# Altium footprint library 3M THD.PcbLib: 163 footprints (part 7 of 14)
Each footprint in its own frame and in the unit in brackets; x right, y up, seen from the top. Pads: shape width x height; smd on the part's side, far side on the other; paste and mask are expansions set on the pad; w line width, h text height; cw(c..) or ccw(c..) is an arc to the next point about the centre after c.
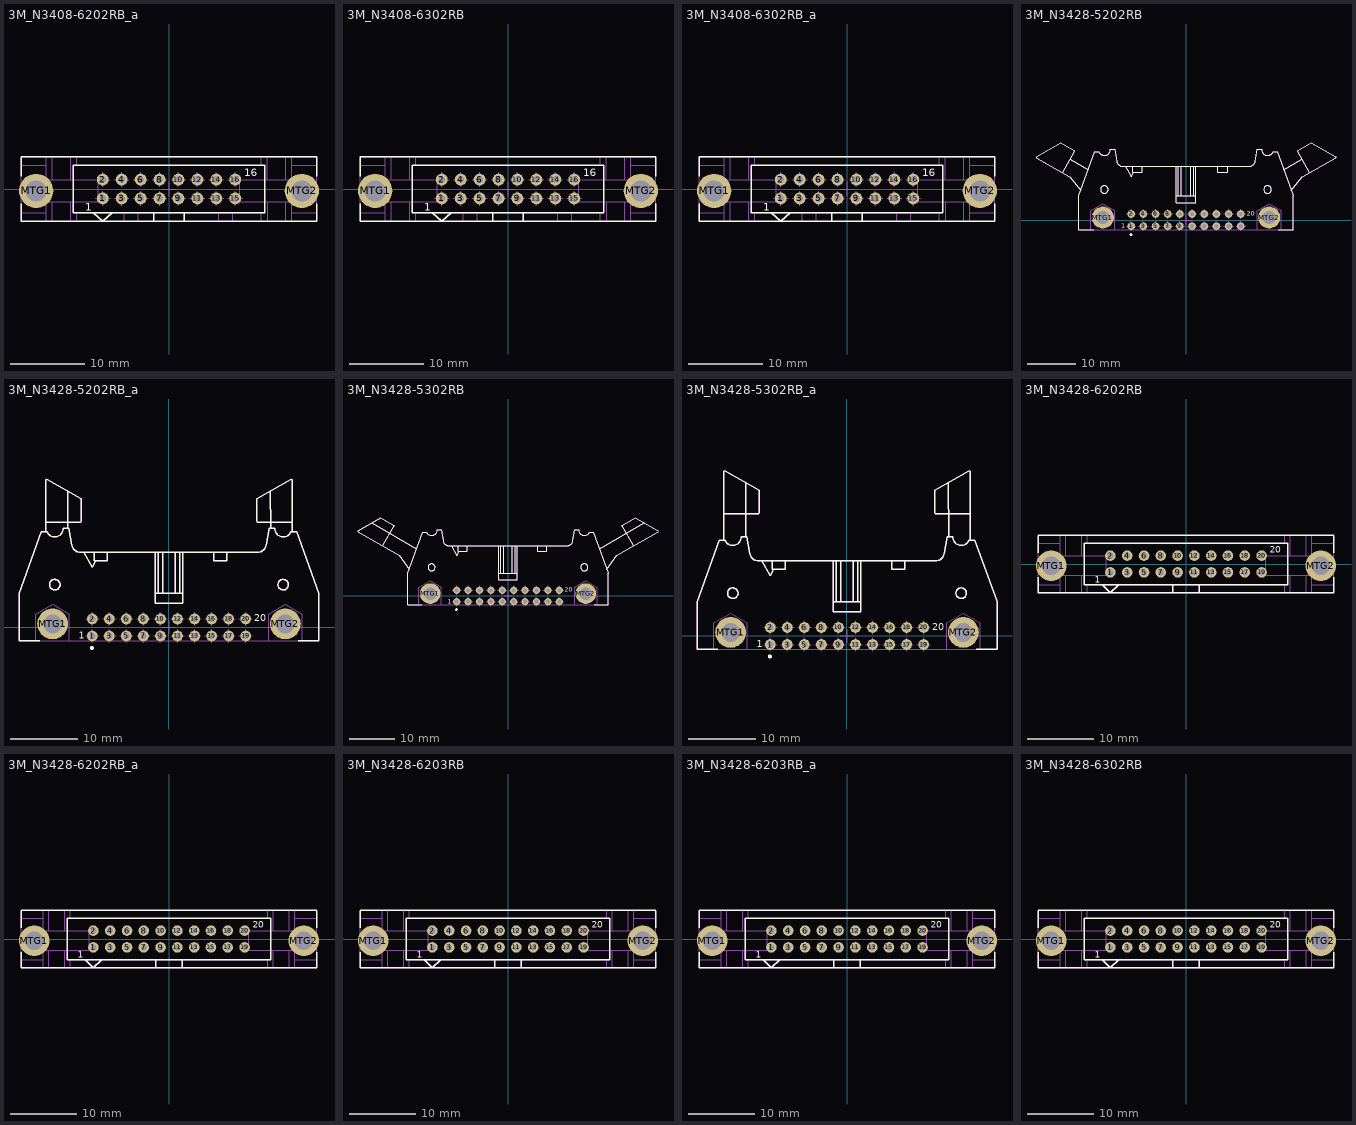
[diagram p6: the footprints below, top view; thin cyan lines are the x and y axes]

## 3M_N3408-6202RB_a [mm] "3M, 3000 Series, 16 Contacts - Pitch 2.54mm - Straight Four-Wall Header (Black) With Short Roll Pin Latch/Ejectors"
height 24.6
pads (18):
  round 1.6 hole 0.9: 1(-8.89,-1.27) 2(-8.89,1.27) 3(-6.35,-1.27) 4(-6.35,1.27) 5(-3.81,-1.27) 6(-3.81,1.27) 7(-1.27,-1.27) 8(-1.27,1.27) 9(1.27,-1.27) 10(1.27,1.27) 11(3.81,-1.27) 12(3.81,1.27) 13(6.35,-1.27) 14(6.35,1.27) 15(8.89,-1.27) 16(8.89,1.27)
  round 4.6 hole 2.8: MTG1(-17.83,-0.254) MTG2(17.83,-0.254)
Top Overlay:
  lines w0.2: -19.812,-2 -19.812,-4.318 19.812,-4.318 19.812,-2 ; -19.812,1.7 -19.812,4.3 ; -19.812,4.318 19.812,4.318 ; -2.032,-4.318 -2.032,-3.175 ; 2.032,-4.318 2.032,-3.175 ; 19.812,1.7 19.812,4.3 ; -12.827,-3.175 12.827,-3.175 12.827,3.175 -12.827,3.175 -12.827,-3.175 ; -10.16,-3.175 -7.62,-3.175 -8.89,-4.318 -10.16,-3.175
  text "1" at -11.227,-2.921 h1.02
  text "16" at 10.125,1.727 h1.02
Mechanical 8:
  lines w0.1: -18.83,-0.254 -17.83,-0.254 ; -17.83,-1.254 -17.83,-0.254 ; -17.83,0.746 -17.83,-0.254 ; -16.83,-0.254 -17.83,-0.254 ; -9.89,-1.27 -8.89,-1.27 ; -9.89,1.27 -8.89,1.27 ; -8.89,-2.27 -8.89,-1.27 ; -8.89,-0.27 -8.89,-1.27 ; -8.89,0.27 -8.89,1.27 ; -8.89,2.27 -8.89,1.27 ; -7.89,-1.27 -8.89,-1.27 ; -7.89,1.27 -8.89,1.27 ; -7.35,-1.27 -6.35,-1.27 ; -7.35,1.27 -6.35,1.27 ; -6.35,-2.27 -6.35,-1.27 ; -6.35,-0.27 -6.35,-1.27 ; -6.35,0.27 -6.35,1.27 ; -6.35,2.27 -6.35,1.27 ; -5.35,-1.27 -6.35,-1.27 ; -5.35,1.27 -6.35,1.27 ; -4.81,-1.27 -3.81,-1.27 ; -4.81,1.27 -3.81,1.27 ; -3.81,-2.27 -3.81,-1.27 ; -3.81,-0.27 -3.81,-1.27 ; -3.81,0.27 -3.81,1.27 ; -3.81,2.27 -3.81,1.27 ; -2.81,-1.27 -3.81,-1.27 ; -2.81,1.27 -3.81,1.27 ; -2.27,-1.27 -1.27,-1.27 ; -2.27,1.27 -1.27,1.27 ; -1.27,-2.27 -1.27,-1.27 ; -1.27,-0.27 -1.27,-1.27 ; -1.27,0.27 -1.27,1.27 ; -1.27,2.27 -1.27,1.27 ; -1,0 0,0 ; -0.27,-1.27 -1.27,-1.27 ; -0.27,1.27 -1.27,1.27 ; 0,-1 0,0 ; 0,1 0,0 ; 0.27,-1.27 1.27,-1.27 ; 0.27,1.27 1.27,1.27 ; 1,0 0,0 ; 1.27,-2.27 1.27,-1.27 ; 1.27,-0.27 1.27,-1.27 ; 1.27,0.27 1.27,1.27 ; 1.27,2.27 1.27,1.27 ; 2.27,-1.27 1.27,-1.27 ; 2.27,1.27 1.27,1.27 ; 2.81,-1.27 3.81,-1.27 ; 2.81,1.27 3.81,1.27 ; 3.81,-2.27 3.81,-1.27 ; 3.81,-0.27 3.81,-1.27 ; 3.81,0.27 3.81,1.27 ; 3.81,2.27 3.81,1.27 ; 4.81,-1.27 3.81,-1.27 ; 4.81,1.27 3.81,1.27 ; 5.35,-1.27 6.35,-1.27 ; 5.35,1.27 6.35,1.27 ; 6.35,-2.27 6.35,-1.27 ; 6.35,-0.27 6.35,-1.27 ; 6.35,0.27 6.35,1.27 ; 6.35,2.27 6.35,1.27 ; 7.35,-1.27 6.35,-1.27 ; 7.35,1.27 6.35,1.27 ; 7.89,-1.27 8.89,-1.27 ; 7.89,1.27 8.89,1.27 ; 8.89,-2.27 8.89,-1.27 ; 8.89,-0.27 8.89,-1.27 ; 8.89,0.27 8.89,1.27 ; 8.89,2.27 8.89,1.27 ; 9.89,-1.27 8.89,-1.27 ; 9.89,1.27 8.89,1.27 ; 16.844,-0.254 17.844,-0.254 ; 17.844,-1.254 17.844,-0.254 ; 17.844,0.746 17.844,-0.254 ; 18.844,-0.254 17.844,-0.254
Mechanical 14:
  circle w0.1: c17.844,-0.254 r1.27
  circle w0.1: c-17.844,-0.254 r1.27
  lines w0.1: -19.812,-3.175 -16.484,-3.175 ; -16.484,-4.318 -16.484,-1.727 -9.525,-1.727 -9.525,1.27 -16.484,1.27 -16.484,4.318 ; -15.642,-4.318 -15.642,-1.727 ; -15.642,1.27 -15.642,4.318 ; -13.209,-4.318 -13.208,-1.727 ; -12.827,-1.727 -12.827,-3.175 12.827,-3.175 12.827,-1.727 ; -12.827,1.27 -12.827,3.175 12.827,3.175 12.827,1.27 ; -6.039,-4.318 -6.039,-3.175 ; -4.121,-4.318 -4.121,-3.175 ; -2.032,-4.318 -2.032,-3.175 ; 2.032,-4.318 2.032,-3.175 ; 6.661,-4.318 6.661,-3.175 ; 8.579,-4.318 8.579,-3.175 ; 12.366,-4.318 12.366,-3.175 ; 12.366,3.175 12.366,4.318 ; 13.208,1.27 13.208,4.318 ; 13.249,-4.318 13.249,-1.727 ; 15.642,-4.318 15.642,-1.727 ; 15.642,1.27 15.642,4.318 ; 16.484,-4.318 16.484,-1.727 9.525,-1.727 9.525,1.27 16.484,1.27 16.484,4.318 ; 16.484,-3.175 19.812,-3.175 ; 16.484,3.175 19.812,3.175 ; -19.812,-4.318 -19.812,4.318 19.812,4.318 19.812,-4.318 -19.812,-4.318 ; -19.812,3.175 -16.484,3.175 -19.812,3.175 ; -19.368,-1.134 -17.844,-2.014 -16.32,-1.134 -16.32,0.626 -17.844,1.506 -19.368,0.626 -19.368,-1.134 ; -13.208,1.27 -13.208,4.318 -13.208,1.27 ; -12.366,-4.318 -12.366,-3.175 -12.366,-4.318 ; -12.366,3.175 -12.366,4.318 -12.366,3.175 ; 16.32,-1.134 17.844,-2.014 19.368,-1.134 19.368,0.626 17.844,1.506 16.32,0.626 16.32,-1.134
  text "1" at -11.227,-2.921 h1.02
  text "16" at 10.125,1.727 h1.02
3D body "3M_N3408-6202RB_a.stp": height 24.64, standoff -2.84, extent -19.812,-4.318 19.812,4.318

## 3M_N3408-6302RB [mm] "3M, 3000 Series, 16 Contacts - Pitch 2.54mm - Straight Four-Wall Header (Black) With Long Roll Pin Latch/Ejectors"
height 27.2
pads (18):
  round 1.6 hole 0.9: 1(-8.89,-1.27) 2(-8.89,1.27) 3(-6.35,-1.27) 4(-6.35,1.27) 5(-3.81,-1.27) 6(-3.81,1.27) 7(-1.27,-1.27) 8(-1.27,1.27) 9(1.27,-1.27) 10(1.27,1.27) 11(3.81,-1.27) 12(3.81,1.27) 13(6.35,-1.27) 14(6.35,1.27) 15(8.89,-1.27) 16(8.89,1.27)
  round 4.6 hole 2.8: MTG1(-17.83,-0.254) MTG2(17.83,-0.254)
Top Overlay:
  lines w0.2: -19.812,-2 -19.812,-4.318 19.812,-4.318 19.812,-2 ; -19.812,1.7 -19.812,4.3 ; -19.812,4.318 19.812,4.318 ; -2.032,-4.318 -2.032,-3.175 ; 2.032,-4.318 2.032,-3.175 ; 19.812,1.7 19.812,4.3 ; -12.827,-3.175 -12.827,3.175 12.827,3.175 12.827,-3.175 -12.827,-3.175 ; -10.16,-3.175 -8.89,-4.318 -7.62,-3.175 -10.16,-3.175
  text "16" at 10.125,1.727 h1.02
  text "1" at -11.227,-2.921 h1.02
Mechanical 8:
  lines w0.1: -18.83,-0.254 -17.83,-0.254 ; -17.83,-1.254 -17.83,-0.254 ; -17.83,0.746 -17.83,-0.254 ; -16.83,-0.254 -17.83,-0.254 ; -9.89,-1.27 -8.89,-1.27 ; -9.89,1.27 -8.89,1.27 ; -8.89,-2.27 -8.89,-1.27 ; -8.89,-0.27 -8.89,-1.27 ; -8.89,0.27 -8.89,1.27 ; -8.89,2.27 -8.89,1.27 ; -7.89,-1.27 -8.89,-1.27 ; -7.89,1.27 -8.89,1.27 ; -7.35,-1.27 -6.35,-1.27 ; -7.35,1.27 -6.35,1.27 ; -6.35,-2.27 -6.35,-1.27 ; -6.35,-0.27 -6.35,-1.27 ; -6.35,0.27 -6.35,1.27 ; -6.35,2.27 -6.35,1.27 ; -5.35,-1.27 -6.35,-1.27 ; -5.35,1.27 -6.35,1.27 ; -4.81,-1.27 -3.81,-1.27 ; -4.81,1.27 -3.81,1.27 ; -3.81,-2.27 -3.81,-1.27 ; -3.81,-0.27 -3.81,-1.27 ; -3.81,0.27 -3.81,1.27 ; -3.81,2.27 -3.81,1.27 ; -2.81,-1.27 -3.81,-1.27 ; -2.81,1.27 -3.81,1.27 ; -2.27,-1.27 -1.27,-1.27 ; -2.27,1.27 -1.27,1.27 ; -1.27,-2.27 -1.27,-1.27 ; -1.27,-0.27 -1.27,-1.27 ; -1.27,0.27 -1.27,1.27 ; -1.27,2.27 -1.27,1.27 ; -1,0 0,0 ; -0.27,-1.27 -1.27,-1.27 ; -0.27,1.27 -1.27,1.27 ; 0,-1 0,0 ; 0,1 0,0 ; 0.27,-1.27 1.27,-1.27 ; 0.27,1.27 1.27,1.27 ; 1,0 0,0 ; 1.27,-2.27 1.27,-1.27 ; 1.27,-0.27 1.27,-1.27 ; 1.27,0.27 1.27,1.27 ; 1.27,2.27 1.27,1.27 ; 2.27,-1.27 1.27,-1.27 ; 2.27,1.27 1.27,1.27 ; 2.81,-1.27 3.81,-1.27 ; 2.81,1.27 3.81,1.27 ; 3.81,-2.27 3.81,-1.27 ; 3.81,-0.27 3.81,-1.27 ; 3.81,0.27 3.81,1.27 ; 3.81,2.27 3.81,1.27 ; 4.81,-1.27 3.81,-1.27 ; 4.81,1.27 3.81,1.27 ; 5.35,-1.27 6.35,-1.27 ; 5.35,1.27 6.35,1.27 ; 6.35,-2.27 6.35,-1.27 ; 6.35,-0.27 6.35,-1.27 ; 6.35,0.27 6.35,1.27 ; 6.35,2.27 6.35,1.27 ; 7.35,-1.27 6.35,-1.27 ; 7.35,1.27 6.35,1.27 ; 7.89,-1.27 8.89,-1.27 ; 7.89,1.27 8.89,1.27 ; 8.89,-2.27 8.89,-1.27 ; 8.89,-0.27 8.89,-1.27 ; 8.89,0.27 8.89,1.27 ; 8.89,2.27 8.89,1.27 ; 9.89,-1.27 8.89,-1.27 ; 9.89,1.27 8.89,1.27 ; 16.844,-0.254 17.844,-0.254 ; 17.844,-1.254 17.844,-0.254 ; 17.844,0.746 17.844,-0.254 ; 18.844,-0.254 17.844,-0.254
Mechanical 14:
  circle w0.1: c-17.844,-0.254 r1.27
  circle w0.1: c17.844,-0.254 r1.27
  lines w0.1: -19.812,-3.175 -16.484,-3.175 ; -16.484,-4.318 -16.484,-1.727 -9.525,-1.727 -9.525,1.27 -16.484,1.27 -16.484,4.318 ; -15.642,-4.318 -15.642,-1.727 ; -15.642,1.27 -15.642,4.318 ; -13.209,-4.318 -13.208,-1.727 ; -12.827,-1.727 -12.827,-3.175 12.827,-3.175 12.827,-1.727 ; -12.827,1.27 -12.827,3.175 12.827,3.175 12.827,1.27 ; -6.039,-4.318 -6.039,-3.175 ; -4.121,-4.318 -4.121,-3.175 ; -2.032,-4.318 -2.032,-3.175 ; 2.032,-4.318 2.032,-3.175 ; 6.661,-4.318 6.661,-3.175 ; 8.579,-4.318 8.579,-3.175 ; 12.366,-4.318 12.366,-3.175 ; 12.366,3.175 12.366,4.318 ; 13.208,1.27 13.208,4.318 ; 13.249,-4.318 13.249,-1.727 ; 15.642,-4.318 15.642,-1.727 ; 15.642,1.27 15.642,4.318 ; 16.484,-4.318 16.484,-1.727 9.525,-1.727 9.525,1.27 16.484,1.27 16.484,4.318 ; 16.484,-3.175 19.812,-3.175 ; 16.484,3.175 19.812,3.175 ; -19.812,-4.318 19.812,-4.318 19.812,4.318 -19.812,4.318 -19.812,-4.318 ; -19.812,3.175 -16.484,3.175 -19.812,3.175 ; -19.368,-1.134 -19.368,0.626 -17.844,1.506 -16.32,0.626 -16.32,-1.134 -17.844,-2.014 -19.368,-1.134 ; -13.208,1.27 -13.208,4.318 -13.208,1.27 ; -12.366,-4.318 -12.366,-3.175 -12.366,-4.318 ; -12.366,3.175 -12.366,4.318 -12.366,3.175 ; 16.32,-1.134 16.32,0.626 17.844,1.506 19.368,0.626 19.368,-1.134 17.844,-2.014 16.32,-1.134
  text "16" at 10.125,1.727 h1.02
  text "1" at -11.227,-2.921 h1.02
3D body "3M_N3408-6302RB.stp": height 19.96, standoff -2.84, extent -30.938,-4.318 30.939,4.318

## 3M_N3408-6302RB_a [mm] "3M, 3000 Series, 16 Contacts - Pitch 2.54mm - Straight Four-Wall Header (Black) With Long Roll Pin Latch/Ejectors"
height 27.2
pads (18):
  round 1.6 hole 0.9: 1(-8.89,-1.27) 2(-8.89,1.27) 3(-6.35,-1.27) 4(-6.35,1.27) 5(-3.81,-1.27) 6(-3.81,1.27) 7(-1.27,-1.27) 8(-1.27,1.27) 9(1.27,-1.27) 10(1.27,1.27) 11(3.81,-1.27) 12(3.81,1.27) 13(6.35,-1.27) 14(6.35,1.27) 15(8.89,-1.27) 16(8.89,1.27)
  round 4.6 hole 2.8: MTG1(-17.83,-0.254) MTG2(17.83,-0.254)
Top Overlay:
  lines w0.2: -19.812,-2 -19.812,-4.318 19.812,-4.318 19.812,-2 ; -19.812,1.7 -19.812,4.3 ; -19.812,4.318 19.812,4.318 ; -2.032,-4.318 -2.032,-3.175 ; 2.032,-4.318 2.032,-3.175 ; 19.812,1.7 19.812,4.3 ; -12.827,-3.175 -12.827,3.175 12.827,3.175 12.827,-3.175 -12.827,-3.175 ; -10.16,-3.175 -8.89,-4.318 -7.62,-3.175 -10.16,-3.175
  text "16" at 10.125,1.727 h1.02
  text "1" at -11.227,-2.921 h1.02
Mechanical 8:
  lines w0.1: -18.83,-0.254 -17.83,-0.254 ; -17.83,-1.254 -17.83,-0.254 ; -17.83,0.746 -17.83,-0.254 ; -16.83,-0.254 -17.83,-0.254 ; -9.89,-1.27 -8.89,-1.27 ; -9.89,1.27 -8.89,1.27 ; -8.89,-2.27 -8.89,-1.27 ; -8.89,-0.27 -8.89,-1.27 ; -8.89,0.27 -8.89,1.27 ; -8.89,2.27 -8.89,1.27 ; -7.89,-1.27 -8.89,-1.27 ; -7.89,1.27 -8.89,1.27 ; -7.35,-1.27 -6.35,-1.27 ; -7.35,1.27 -6.35,1.27 ; -6.35,-2.27 -6.35,-1.27 ; -6.35,-0.27 -6.35,-1.27 ; -6.35,0.27 -6.35,1.27 ; -6.35,2.27 -6.35,1.27 ; -5.35,-1.27 -6.35,-1.27 ; -5.35,1.27 -6.35,1.27 ; -4.81,-1.27 -3.81,-1.27 ; -4.81,1.27 -3.81,1.27 ; -3.81,-2.27 -3.81,-1.27 ; -3.81,-0.27 -3.81,-1.27 ; -3.81,0.27 -3.81,1.27 ; -3.81,2.27 -3.81,1.27 ; -2.81,-1.27 -3.81,-1.27 ; -2.81,1.27 -3.81,1.27 ; -2.27,-1.27 -1.27,-1.27 ; -2.27,1.27 -1.27,1.27 ; -1.27,-2.27 -1.27,-1.27 ; -1.27,-0.27 -1.27,-1.27 ; -1.27,0.27 -1.27,1.27 ; -1.27,2.27 -1.27,1.27 ; -1,0 0,0 ; -0.27,-1.27 -1.27,-1.27 ; -0.27,1.27 -1.27,1.27 ; 0,-1 0,0 ; 0,1 0,0 ; 0.27,-1.27 1.27,-1.27 ; 0.27,1.27 1.27,1.27 ; 1,0 0,0 ; 1.27,-2.27 1.27,-1.27 ; 1.27,-0.27 1.27,-1.27 ; 1.27,0.27 1.27,1.27 ; 1.27,2.27 1.27,1.27 ; 2.27,-1.27 1.27,-1.27 ; 2.27,1.27 1.27,1.27 ; 2.81,-1.27 3.81,-1.27 ; 2.81,1.27 3.81,1.27 ; 3.81,-2.27 3.81,-1.27 ; 3.81,-0.27 3.81,-1.27 ; 3.81,0.27 3.81,1.27 ; 3.81,2.27 3.81,1.27 ; 4.81,-1.27 3.81,-1.27 ; 4.81,1.27 3.81,1.27 ; 5.35,-1.27 6.35,-1.27 ; 5.35,1.27 6.35,1.27 ; 6.35,-2.27 6.35,-1.27 ; 6.35,-0.27 6.35,-1.27 ; 6.35,0.27 6.35,1.27 ; 6.35,2.27 6.35,1.27 ; 7.35,-1.27 6.35,-1.27 ; 7.35,1.27 6.35,1.27 ; 7.89,-1.27 8.89,-1.27 ; 7.89,1.27 8.89,1.27 ; 8.89,-2.27 8.89,-1.27 ; 8.89,-0.27 8.89,-1.27 ; 8.89,0.27 8.89,1.27 ; 8.89,2.27 8.89,1.27 ; 9.89,-1.27 8.89,-1.27 ; 9.89,1.27 8.89,1.27 ; 16.844,-0.254 17.844,-0.254 ; 17.844,-1.254 17.844,-0.254 ; 17.844,0.746 17.844,-0.254 ; 18.844,-0.254 17.844,-0.254
Mechanical 14:
  circle w0.1: c-17.844,-0.254 r1.27
  circle w0.1: c17.844,-0.254 r1.27
  lines w0.1: -19.812,-3.175 -16.484,-3.175 ; -16.484,-4.318 -16.484,-1.727 -9.525,-1.727 -9.525,1.27 -16.484,1.27 -16.484,4.318 ; -15.642,-4.318 -15.642,-1.727 ; -15.642,1.27 -15.642,4.318 ; -13.209,-4.318 -13.208,-1.727 ; -12.827,-1.727 -12.827,-3.175 12.827,-3.175 12.827,-1.727 ; -12.827,1.27 -12.827,3.175 12.827,3.175 12.827,1.27 ; -6.039,-4.318 -6.039,-3.175 ; -4.121,-4.318 -4.121,-3.175 ; -2.032,-4.318 -2.032,-3.175 ; 2.032,-4.318 2.032,-3.175 ; 6.661,-4.318 6.661,-3.175 ; 8.579,-4.318 8.579,-3.175 ; 12.366,-4.318 12.366,-3.175 ; 12.366,3.175 12.366,4.318 ; 13.208,1.27 13.208,4.318 ; 13.249,-4.318 13.249,-1.727 ; 15.642,-4.318 15.642,-1.727 ; 15.642,1.27 15.642,4.318 ; 16.484,-4.318 16.484,-1.727 9.525,-1.727 9.525,1.27 16.484,1.27 16.484,4.318 ; 16.484,-3.175 19.812,-3.175 ; 16.484,3.175 19.812,3.175 ; -19.812,-4.318 19.812,-4.318 19.812,4.318 -19.812,4.318 -19.812,-4.318 ; -19.812,3.175 -16.484,3.175 -19.812,3.175 ; -19.368,-1.134 -19.368,0.626 -17.844,1.506 -16.32,0.626 -16.32,-1.134 -17.844,-2.014 -19.368,-1.134 ; -13.208,1.27 -13.208,4.318 -13.208,1.27 ; -12.366,-4.318 -12.366,-3.175 -12.366,-4.318 ; -12.366,3.175 -12.366,4.318 -12.366,3.175 ; 16.32,-1.134 16.32,0.626 17.844,1.506 19.368,0.626 19.368,-1.134 17.844,-2.014 16.32,-1.134
  text "16" at 10.125,1.727 h1.02
  text "1" at -11.227,-2.921 h1.02
3D body "3M_N3408-6302RB_a.stp": height 27.18, standoff -2.84, extent -19.812,-4.318 19.812,4.318

## 3M_N3428-5202RB [mm] "3M, 3000 Series, 20 Contacts - Pitch 2.54mm - Right Angle Four-Wall Header (Black) With Short Roll Pin Latch/Ejectors"
height 8.6
pads (22):
  round 1.6 hole 0.9: 1(-11.43,-1.27) 2(-11.43,1.27) 3(-8.89,-1.27) 4(-8.89,1.27) 5(-6.35,-1.27) 6(-6.35,1.27) 7(-3.81,-1.27) 8(-3.81,1.27) 9(-1.27,-1.27) 10(-1.27,1.27) 11(1.27,-1.27) 12(1.27,1.27) 13(3.81,-1.27) 14(3.81,1.27) 15(6.35,-1.27) 16(6.35,1.27) 17(8.89,-1.27) 18(8.89,1.27) 19(11.43,-1.27) 20(11.43,1.27)
  round 4.6 hole 2.8: MTG1(-17.336,0.533) MTG2(17.336,0.533)
Top Overlay:
  circle w0.2: c17.018,6.375 r0.787
  circle w0.2: c-17.018,6.375 r0.787
  circle w0.3: c-11.503,-3.048 r0.15
  lines w0.2: -25.757,9.877 -23.179,14.342 ccw(c-23.267,14.393) -23.216,14.481 -26.131,16.163 -31.236,13.216 ccw(c-31.185,13.128) -31.236,13.04 -24.247,9.005 -21.935,6.25 ; -24.144,12.67 -20.388,10.502 ; -19.24,-2.007 -22.352,-2.007 -22.352,5.105 -19.024,14.249 -18.182,14.249 ccw(c-17.018,14.757) -15.748,14.757 -14.906,14.757 -14.464,12.251 ccw(c-13.213,12.471) -13.213,11.201 13.213,11.201 ccw(c13.213,12.471) 14.464,12.251 14.906,14.757 15.748,14.757 ccw(c17.018,14.757) 18.182,14.249 19.024,14.249 22.352,5.105 22.352,-2.007 19.24,-2.007 ; -12.694,11.201 -11.424,9.002 -10.887,9.931 ; -11.119,11.201 -11.119,9.931 -9.201,9.931 -9.208,11.201 ; -2.032,5.105 2.032,5.105 ; -2.032,11.201 -2.032,3.581 2.032,3.581 2.032,11.201 ; -1.587,5.105 -1.587,11.201 ; -0.953,5.105 -0.953,11.201 ; 0.953,5.105 0.953,11.201 ; 1.587,5.105 1.587,11.201 ; 6.668,11.201 6.661,9.931 8.579,9.931 8.573,11.201 ; 20.388,10.502 24.144,12.67 ; 21.935,6.25 24.247,9.005 31.236,13.04 ccw(c31.185,13.128) 31.236,13.216 26.131,16.163 23.216,14.481 ccw(c23.267,14.393) 23.179,14.342 25.757,9.877
  text "1" at -13.462,-1.7 h1.02
  text "20" at 12.69,0.889 h1.02
Mechanical 8:
  lines w0.1: -18.336,0.533 -17.336,0.533 ; -17.336,-0.467 -17.336,0.533 ; -17.336,1.533 -17.336,0.533 ; -16.336,0.533 -17.336,0.533 ; -12.43,-1.27 -11.43,-1.27 ; -12.43,1.27 -11.43,1.27 ; -11.43,-2.27 -11.43,-1.27 ; -11.43,-0.27 -11.43,-1.27 ; -11.43,0.27 -11.43,1.27 ; -11.43,2.27 -11.43,1.27 ; -10.43,-1.27 -11.43,-1.27 ; -10.43,1.27 -11.43,1.27 ; -9.89,-1.27 -8.89,-1.27 ; -9.89,1.27 -8.89,1.27 ; -8.89,-2.27 -8.89,-1.27 ; -8.89,-0.27 -8.89,-1.27 ; -8.89,0.27 -8.89,1.27 ; -8.89,2.27 -8.89,1.27 ; -7.89,-1.27 -8.89,-1.27 ; -7.89,1.27 -8.89,1.27 ; -7.35,-1.27 -6.35,-1.27 ; -7.35,1.27 -6.35,1.27 ; -6.35,-2.27 -6.35,-1.27 ; -6.35,-0.27 -6.35,-1.27 ; -6.35,0.27 -6.35,1.27 ; -6.35,2.27 -6.35,1.27 ; -5.35,-1.27 -6.35,-1.27 ; -5.35,1.27 -6.35,1.27 ; -4.81,-1.27 -3.81,-1.27 ; -4.81,1.27 -3.81,1.27 ; -3.81,-2.27 -3.81,-1.27 ; -3.81,-0.27 -3.81,-1.27 ; -3.81,0.27 -3.81,1.27 ; -3.81,2.27 -3.81,1.27 ; -2.81,-1.27 -3.81,-1.27 ; -2.81,1.27 -3.81,1.27 ; -2.27,-1.27 -1.27,-1.27 ; -2.27,1.27 -1.27,1.27 ; -1.27,-2.27 -1.27,-1.27 ; -1.27,-0.27 -1.27,-1.27 ; -1.27,0.27 -1.27,1.27 ; -1.27,2.27 -1.27,1.27 ; -1,0 0,0 ; -0.27,-1.27 -1.27,-1.27 ; -0.27,1.27 -1.27,1.27 ; 0,-1 0,0 ; 0,1 0,0 ; 0.27,-1.27 1.27,-1.27 ; 0.27,1.27 1.27,1.27 ; 1,0 0,0 ; 1.27,-2.27 1.27,-1.27 ; 1.27,-0.27 1.27,-1.27 ; 1.27,0.27 1.27,1.27 ; 1.27,2.27 1.27,1.27 ; 2.27,-1.27 1.27,-1.27 ; 2.27,1.27 1.27,1.27 ; 2.81,-1.27 3.81,-1.27 ; 2.81,1.27 3.81,1.27 ; 3.81,-2.27 3.81,-1.27 ; 3.81,-0.27 3.81,-1.27 ; 3.81,0.27 3.81,1.27 ; 3.81,2.27 3.81,1.27 ; 4.81,-1.27 3.81,-1.27 ; 4.81,1.27 3.81,1.27 ; 5.35,-1.27 6.35,-1.27 ; 5.35,1.27 6.35,1.27 ; 6.35,-2.27 6.35,-1.27 ; 6.35,-0.27 6.35,-1.27 ; 6.35,0.27 6.35,1.27 ; 6.35,2.27 6.35,1.27 ; 7.35,-1.27 6.35,-1.27 ; 7.35,1.27 6.35,1.27 ; 7.89,-1.27 8.89,-1.27 ; 7.89,1.27 8.89,1.27 ; 8.89,-2.27 8.89,-1.27 ; 8.89,-0.27 8.89,-1.27 ; 8.89,0.27 8.89,1.27 ; 8.89,2.27 8.89,1.27 ; 9.89,-1.27 8.89,-1.27 ; 9.89,1.27 8.89,1.27 ; 10.43,-1.27 11.43,-1.27 ; 10.43,1.27 11.43,1.27 ; 11.43,-2.27 11.43,-1.27 ; 11.43,-0.27 11.43,-1.27 ; 11.43,0.27 11.43,1.27 ; 11.43,2.27 11.43,1.27 ; 12.43,-1.27 11.43,-1.27 ; 12.43,1.27 11.43,1.27 ; 16.336,0.533 17.336,0.533 ; 17.336,-0.467 17.336,0.533 ; 17.336,1.533 17.336,0.533 ; 18.336,0.533 17.336,0.533
Mechanical 14:
  circle w0.1: c-17.336,0.533 r1.27
  circle w0.1: c17.336,0.533 r1.27
  circle w0.1: c17.018,6.375 r0.787
  circle w0.1: c-17.018,6.375 r0.787
  lines w0.1: -25.757,9.877 -23.179,14.342 ccw(c-23.267,14.393) -23.216,14.481 -26.131,16.163 -31.236,13.216 ccw(c-31.185,13.128) -31.236,13.04 -24.247,9.005 -21.935,6.25 ; -24.144,12.67 -20.388,10.502 ; -19.837,-2.007 -19.837,1.978 -17.336,3.422 -14.834,1.978 -14.834,-2.007 ; -12.694,11.201 -11.424,9.002 -10.887,9.931 ; -11.119,11.201 -11.119,9.931 -9.201,9.931 -9.208,11.201 ; -2.032,5.105 2.032,5.105 ; -2.032,11.201 -2.032,3.581 2.032,3.581 2.032,11.201 ; -1.587,5.105 -1.587,11.201 ; -0.953,5.105 -0.953,11.201 ; 0.953,5.105 0.953,11.201 ; 1.587,5.105 1.587,11.201 ; 6.668,11.201 6.661,9.931 8.579,9.931 8.573,11.201 ; 14.834,-2.007 14.834,1.978 17.336,3.422 19.837,1.978 19.837,-2.007 ; 20.388,10.502 24.144,12.67 ; 21.935,6.25 24.247,9.005 31.236,13.04 ccw(c31.185,13.128) 31.236,13.216 26.131,16.163 23.216,14.481 ccw(c23.267,14.393) 23.179,14.342 25.757,9.877 ; -22.352,-2.007 22.352,-2.007 22.352,5.105 19.024,14.249 18.182,14.249 cw(c17.018,14.757) 15.748,14.757 14.906,14.757 14.464,12.251 cw(c13.213,12.471) 13.213,11.201 -13.213,11.201 cw(c-13.213,12.471) -14.464,12.251 -14.906,14.757 -15.748,14.757 cw(c-17.018,14.757) -18.182,14.249 -19.024,14.249 -22.352,5.105 -22.352,-2.007
  text "1" at -13.462,-1.7 h1.02
  text "20" at 12.69,0.889 h1.02
3D body "3M_N3428-5202RB.stp": height 8.64, standoff -2.84, extent -31.281,-2.514 31.281,16.179

## 3M_N3428-5202RB_a [mm] "3M, 3000 Series, 20 Contacts - Pitch 2.54mm - Right Angle Four-Wall Header (Black) With Short Roll Pin Latch/Ejectors"
height 8.6
pads (22):
  round 1.6 hole 0.9: 1(-11.43,-1.27) 2(-11.43,1.27) 3(-8.89,-1.27) 4(-8.89,1.27) 5(-6.35,-1.27) 6(-6.35,1.27) 7(-3.81,-1.27) 8(-3.81,1.27) 9(-1.27,-1.27) 10(-1.27,1.27) 11(1.27,-1.27) 12(1.27,1.27) 13(3.81,-1.27) 14(3.81,1.27) 15(6.35,-1.27) 16(6.35,1.27) 17(8.89,-1.27) 18(8.89,1.27) 19(11.43,-1.27) 20(11.43,1.27)
  round 4.6 hole 2.8: MTG1(-17.335,0.533) MTG2(17.336,0.533)
Top Overlay:
  circle w0.2: c17.018,6.375 r0.787
  circle w0.2: c-17.018,6.375 r0.787
  circle w0.3: c-11.503,-3.048 r0.15
  lines w0.2: -19.24,-2.007 -22.352,-2.007 -22.352,5.105 -19.024,14.249 -18.182,14.249 ccw(c-17.018,14.757) -15.748,14.757 -14.906,14.757 -14.464,12.251 ccw(c-13.213,12.471) -13.213,11.201 13.214,11.201 ccw(c13.214,12.471) 14.464,12.251 14.906,14.757 15.748,14.757 ccw(c17.018,14.757) 18.182,14.249 19.024,14.249 22.352,5.105 22.352,-2.007 19.24,-2.007 ; -18.339,14.249 -18.339,22.024 -18.186,22.112 -13.081,19.164 -13.081,15.799 -13.182,15.697 -18.339,15.697 ; -15.113,14.757 -15.113,20.337 ; -12.694,11.201 -11.424,9.002 -10.887,9.931 ; -11.119,11.201 -11.119,9.931 -9.201,9.931 -9.207,11.201 ; -2.032,5.105 2.032,5.105 ; -2.032,11.201 -2.032,3.581 2.032,3.581 2.032,11.201 ; -1.587,5.105 -1.587,11.201 ; -0.952,5.105 -0.952,11.201 ; 0.953,5.105 0.953,11.201 ; 1.588,5.105 1.588,11.201 ; 6.668,11.201 6.661,9.931 8.579,9.931 8.573,11.201 ; 15.12,20.342 15.137,14.757 ; 18.339,14.249 18.339,22.024 18.187,22.112 13.081,19.164 13.081,15.799 13.183,15.697 18.339,15.697
  text "1" at -13.462,-1.7 h1.02
  text "20" at 12.69,0.889 h1.02
Mechanical 8:
  lines w0.1: -18.335,0.533 -17.335,0.533 ; -17.335,-0.467 -17.335,0.533 ; -17.335,1.533 -17.335,0.533 ; -16.335,0.533 -17.335,0.533 ; -12.43,-1.27 -11.43,-1.27 ; -12.43,1.27 -11.43,1.27 ; -11.43,-2.27 -11.43,-1.27 ; -11.43,-0.27 -11.43,-1.27 ; -11.43,0.27 -11.43,1.27 ; -11.43,2.27 -11.43,1.27 ; -10.43,-1.27 -11.43,-1.27 ; -10.43,1.27 -11.43,1.27 ; -9.89,-1.27 -8.89,-1.27 ; -9.89,1.27 -8.89,1.27 ; -8.89,-2.27 -8.89,-1.27 ; -8.89,-0.27 -8.89,-1.27 ; -8.89,0.27 -8.89,1.27 ; -8.89,2.27 -8.89,1.27 ; -7.89,-1.27 -8.89,-1.27 ; -7.89,1.27 -8.89,1.27 ; -7.35,-1.27 -6.35,-1.27 ; -7.35,1.27 -6.35,1.27 ; -6.35,-2.27 -6.35,-1.27 ; -6.35,-0.27 -6.35,-1.27 ; -6.35,0.27 -6.35,1.27 ; -6.35,2.27 -6.35,1.27 ; -5.35,-1.27 -6.35,-1.27 ; -5.35,1.27 -6.35,1.27 ; -4.81,-1.27 -3.81,-1.27 ; -4.81,1.27 -3.81,1.27 ; -3.81,-2.27 -3.81,-1.27 ; -3.81,-0.27 -3.81,-1.27 ; -3.81,0.27 -3.81,1.27 ; -3.81,2.27 -3.81,1.27 ; -2.81,-1.27 -3.81,-1.27 ; -2.81,1.27 -3.81,1.27 ; -2.27,-1.27 -1.27,-1.27 ; -2.27,1.27 -1.27,1.27 ; -1.27,-2.27 -1.27,-1.27 ; -1.27,-0.27 -1.27,-1.27 ; -1.27,0.27 -1.27,1.27 ; -1.27,2.27 -1.27,1.27 ; -1,0 0,0 ; -0.27,-1.27 -1.27,-1.27 ; -0.27,1.27 -1.27,1.27 ; 0,-1 0,0 ; 0,1 0,0 ; 0.27,-1.27 1.27,-1.27 ; 0.27,1.27 1.27,1.27 ; 1,0 0,0 ; 1.27,-2.27 1.27,-1.27 ; 1.27,-0.27 1.27,-1.27 ; 1.27,0.27 1.27,1.27 ; 1.27,2.27 1.27,1.27 ; 2.27,-1.27 1.27,-1.27 ; 2.27,1.27 1.27,1.27 ; 2.81,-1.27 3.81,-1.27 ; 2.81,1.27 3.81,1.27 ; 3.81,-2.27 3.81,-1.27 ; 3.81,-0.27 3.81,-1.27 ; 3.81,0.27 3.81,1.27 ; 3.81,2.27 3.81,1.27 ; 4.81,-1.27 3.81,-1.27 ; 4.81,1.27 3.81,1.27 ; 5.35,-1.27 6.35,-1.27 ; 5.35,1.27 6.35,1.27 ; 6.35,-2.27 6.35,-1.27 ; 6.35,-0.27 6.35,-1.27 ; 6.35,0.27 6.35,1.27 ; 6.35,2.27 6.35,1.27 ; 7.35,-1.27 6.35,-1.27 ; 7.35,1.27 6.35,1.27 ; 7.89,-1.27 8.89,-1.27 ; 7.89,1.27 8.89,1.27 ; 8.89,-2.27 8.89,-1.27 ; 8.89,-0.27 8.89,-1.27 ; 8.89,0.27 8.89,1.27 ; 8.89,2.27 8.89,1.27 ; 9.89,-1.27 8.89,-1.27 ; 9.89,1.27 8.89,1.27 ; 10.43,-1.27 11.43,-1.27 ; 10.43,1.27 11.43,1.27 ; 11.43,-2.27 11.43,-1.27 ; 11.43,-0.27 11.43,-1.27 ; 11.43,0.27 11.43,1.27 ; 11.43,2.27 11.43,1.27 ; 12.43,-1.27 11.43,-1.27 ; 12.43,1.27 11.43,1.27 ; 16.336,0.533 17.336,0.533 ; 17.336,-0.467 17.336,0.533 ; 17.336,1.533 17.336,0.533 ; 18.336,0.533 17.336,0.533